# Altium footprint library Connect.PcbLib: 272 footprints (part 5 of 17)
Each footprint in its own frame and in the unit in brackets; x right, y up, seen from the top. Pads: shape width x height; smd on the part's side, far side on the other; paste and mask are expansions set on the pad; w line width, h text height; cw(c..) or ccw(c..) is an arc to the next point about the centre after c.
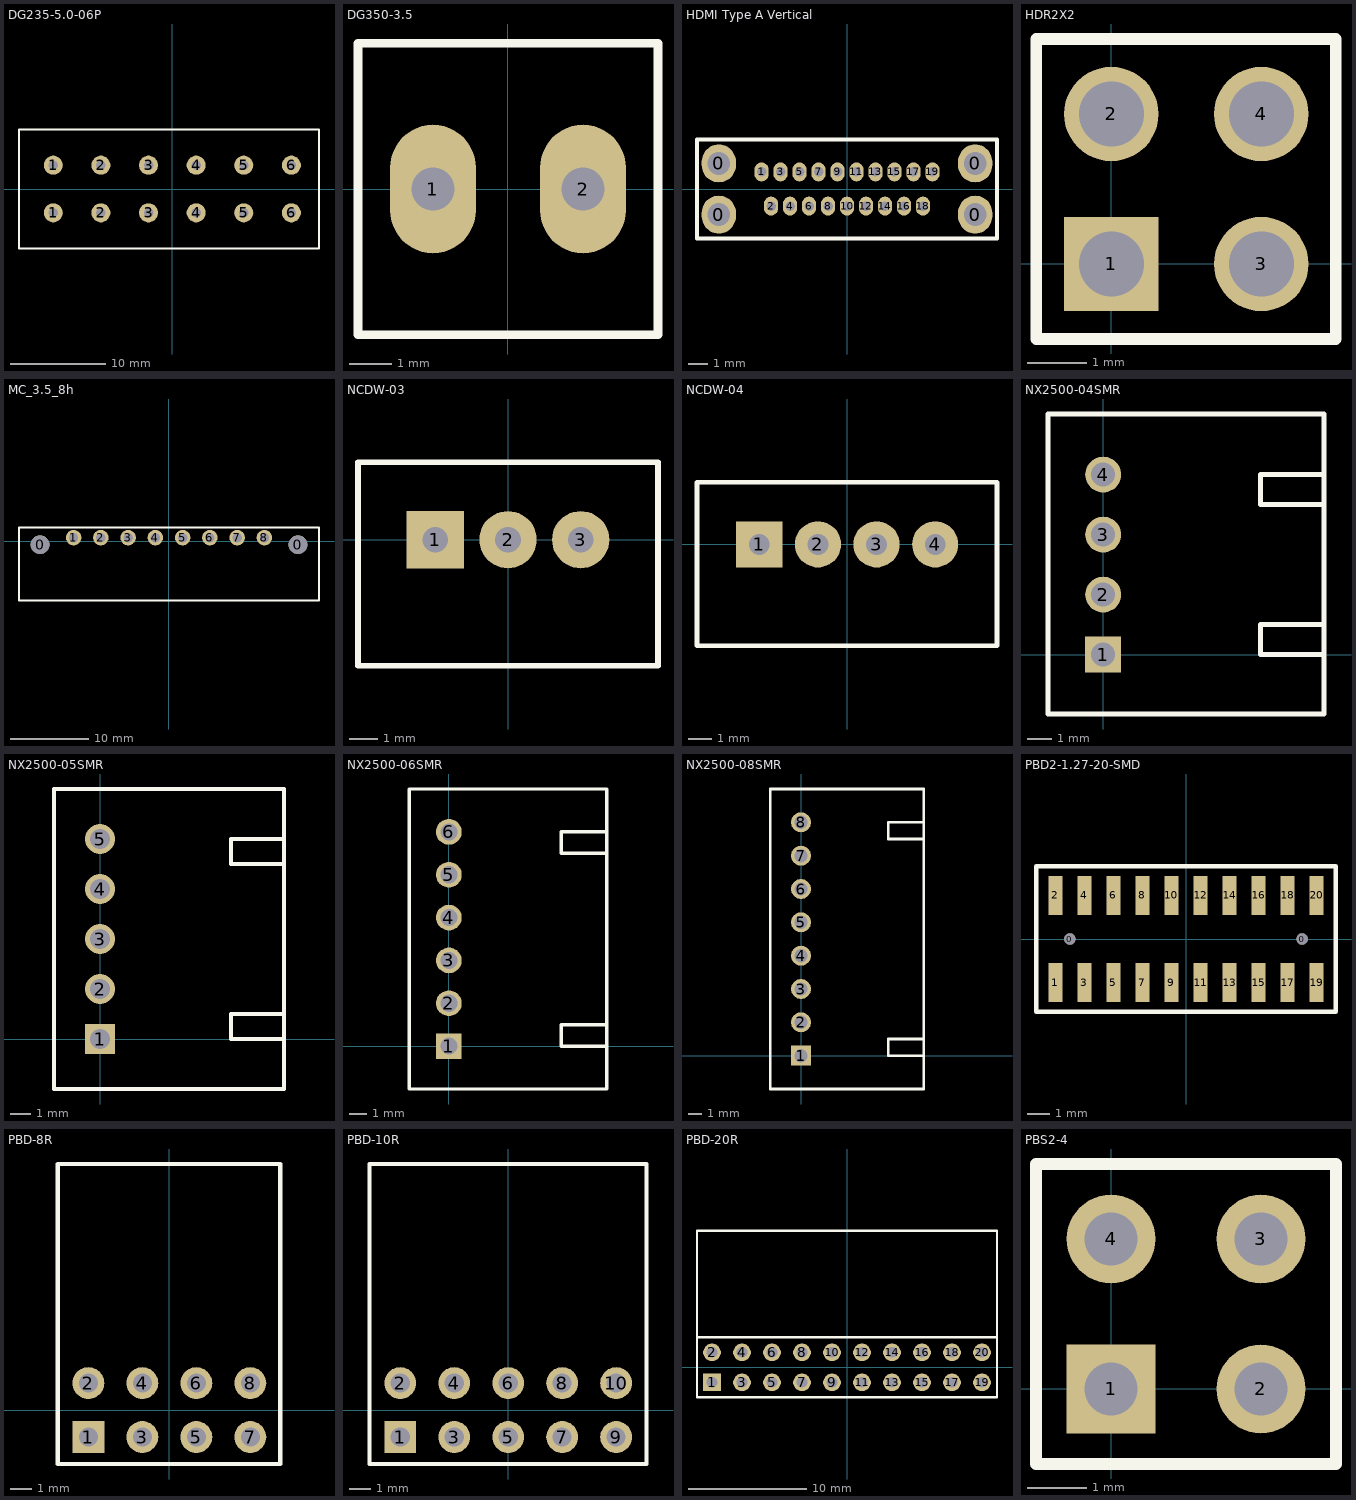
[diagram p4: the footprints below, top view; thin cyan lines are the x and y axes]

## DG235-5.0-06P [mm]
height 15.5
pads (12):
  round 2 hole 1: 1(-12.5,-2.5) 1(-12.5,2.5) 2(-7.5,-2.5) 2(-7.5,2.5) 3(-2.5,-2.5) 3(-2.5,2.5) 4(2.5,-2.5) 4(2.5,2.5) 5(7.5,-2.5) 5(7.5,2.5) 6(12.5,-2.5) 6(12.5,2.5)
Top Overlay:
  lines w0.2: -16.1,-6.25 15.4,-6.25 15.4,6.25 -16.1,6.25 -16.1,-6.25
3D body: height 0, standoff -3.6, extent 2.3,-2.9 2.7,-2.1
3D body: height 0, standoff -3.6, extent 2.3,2.1 2.7,2.9
3D body: height 6, standoff 2, extent 0.75,-6.15 4.75,3.85
3D body: height 12, standoff 11, extent 0.3,-2.75 4.55,2
3D body: height 11, standoff 9, extent 0.575,-1.25 2.575,1.25
3D body: height 9, standoff 7, extent 0.3,-2.5 4.55,2.5
3D body: height 7, standoff 0, extent 0.3,-6.1 5.275,6.1
3D body: height 7, standoff 0, extent -4.7,-6.1 0.275,6.1
3D body: height 9, standoff 7, extent -4.7,-2.5 -0.45,2.5
3D body: height 11, standoff 9, extent -4.425,-1.25 -2.425,1.25
3D body: height 12, standoff 11, extent -4.7,-2.75 -0.45,2
3D body: height 6, standoff 2, extent -4.25,-6.15 -0.25,3.85
3D body: height 0, standoff -3.6, extent -2.7,2.1 -2.3,2.9
3D body: height 0, standoff -3.6, extent -2.7,-2.9 -2.3,-2.1
3D body: height 7, standoff 0, extent -14.7,-6.1 -9.725,6.1
3D body: height 9, standoff 7, extent -14.7,-2.5 -10.45,2.5
3D body: height 11, standoff 9, extent -14.425,-1.25 -12.425,1.25
3D body: height 12, standoff 11, extent -14.7,-2.75 -10.45,2
3D body: height 6, standoff 2, extent -14.25,-6.15 -10.25,3.85
3D body: height 0, standoff -3.6, extent -12.7,2.1 -12.3,2.9
3D body: height 0, standoff -3.6, extent -12.7,-2.9 -12.3,-2.1
3D body: height 0, standoff -3.6, extent -7.7,-2.9 -7.3,-2.1
3D body: height 0, standoff -3.6, extent -7.7,2.1 -7.3,2.9
3D body: height 6, standoff 2, extent -9.25,-6.15 -5.25,3.85
3D body: height 12, standoff 11, extent -9.7,-2.75 -5.45,2
3D body: height 11, standoff 9, extent -9.425,-1.25 -7.425,1.25
3D body: height 9, standoff 7, extent -9.7,-2.5 -5.45,2.5
3D body: height 7, standoff 0, extent -9.7,-6.1 -4.725,6.1
3D body: height 7, standoff 0, extent 5.3,-6.1 10.275,6.1
3D body: height 9, standoff 7, extent 5.3,-2.5 9.55,2.5
3D body: height 11, standoff 9, extent 5.575,-1.25 7.575,1.25
3D body: height 12, standoff 11, extent 5.3,-2.75 9.55,2
3D body: height 6, standoff 2, extent 5.75,-6.15 9.75,3.85
3D body: height 0, standoff -3.6, extent 7.3,2.1 7.7,2.9
3D body: height 0, standoff -3.6, extent 7.3,-2.9 7.7,-2.1
3D body: height 0, standoff -3.6, extent 12.3,-2.9 12.7,-2.1
3D body: height 0, standoff -3.6, extent 12.3,2.1 12.7,2.9
3D body: height 6, standoff 2, extent 10.75,-6.15 14.75,3.85
3D body: height 12, standoff 11, extent 10.3,-2.75 14.55,2
3D body: height 11, standoff 9, extent 10.575,-1.25 12.575,1.25
3D body: height 9, standoff 7, extent 10.3,-2.5 14.55,2.5
3D body: height 7, standoff 0, extent 10.3,-6.1 15.275,6.1

## DG350-3.5 [mm] "DEGSON"
height 8.4
pads (2):
  oval 2x3 hole 1: 1(-1.75,0) 2(1.75,0)
Top Overlay:
  lines w0.2: -3.5,-3.4 3.5,-3.4 3.5,3.4 -3.5,3.4 -3.5,-3.4
3D body "a-tb350-3.5_2.stp": height 8.4, standoff -3.79, extent -4.022,-3.6 3.972,3.4

## HDMI Type A Vertical [mm]
pads (23):
  oval 1.8x2 hole 1.2: 0(-6.75,-1.35) 0(-6.75,1.35) 0(6.75,-1.35) 0(6.75,1.35)
  oval 0.75x1 hole 0.5: 1(-4.5,0.9) 2(-4,-0.9) 3(-3.5,0.9) 4(-3,-0.9) 5(-2.5,0.9) 6(-2,-0.9) 7(-1.5,0.9) 8(-1,-0.9) 9(-0.5,0.9) 10(0,-0.9) 11(0.5,0.9) 12(1,-0.9) 13(1.5,0.9) 14(2,-0.9) 15(2.5,0.9) 16(3,-0.9) 17(3.5,0.9) 18(4,-0.9) 19(4.5,0.9)
Top Overlay:
  lines w0.2: -7.9,-2.6 7.9,-2.6 7.9,2.6 -7.9,2.6 -7.9,-2.6
3D body "HDMI_Type_A_vertical.STEP": height 13.5, standoff -3.8, extent -7.45,-2.475 7.45,2.475

## HDR2X2 [mm] "Connector; Header; 3x2 Position"
pads (4):
  rect 1.6x1.6 hole 1.1: 1(0,0)
  round 1.6 hole 1.1: 2(0,2.54) 3(2.54,0) 4(2.54,2.54)
Top Overlay:
  lines w0.2: -1.27,-1.27 3.8,-1.27 3.8,3.81 -1.27,3.81 -1.27,-1.27

## MC_3.5_8h [mm]
pads (10):
  round 2.4 hole 2.4: 0(-16.55,-0.45) 0(16.55,-0.45)
  round 2 hole 1.2: 1(-12.25,0.45) 2(-8.75,0.45) 3(-5.25,0.45) 4(-1.75,0.45) 5(1.75,0.45) 6(5.25,0.45) 7(8.75,0.45) 8(12.25,0.45)
Top Overlay:
  lines w0.2: -19.25,-7.625 -19.25,1.75 19.25,1.75 19.25,-7.625 -19.25,-7.625
3D body "MC 1,5_8-GF-3,5 - Base strip.stp": height 7.25, standoff -3.4, extent -19.15,-7.55 19.15,1.65

## NCDW-03 [mm]
pads (3):
  rect 2x2 hole 0.9: 1(-2.54,0)
  round 2 hole 0.9: 2(0,0) 3(2.54,0)
Top Overlay:
  lines w0.2: -5.24,-4.4 -5.24,2.7 5.24,2.7 5.24,-4.4 -5.24,-4.4
3D body "NCDW-03_2.54.STEP": height 11.4, standoff -3, extent -5.08,-3.706 5.1,2.5

## NCDW-04 [mm]
pads (4):
  rect 2x2 hole 0.9: 1(-3.81,0)
  round 2 hole 0.9: 2(-1.27,0) 3(1.27,0) 4(3.81,0)
Top Overlay:
  lines w0.2: -6.51,-4.4 -6.51,2.7 6.49,2.7 6.49,-4.4 -6.51,-4.4
3D body "NCDW-04_2.54_.STEP": height 11.4, standoff -3, extent -6.25,-3.9 6.25,2.45

## NX2500-04SMR [mm] "Connector; Header; 1x4 Position; 2.5 mm"
height 5.7
pads (4):
  rect 1.5x1.5 hole 1: 1(0,0)
  round 1.5 hole 1: 2(0,2.5) 3(0,5) 4(0,7.5)
Top Overlay:
  lines w0.2: 9.2,0 6.55,0 6.55,1.25 9.2,1.25 ; 9.2,6.25 6.55,6.25 6.55,7.5 9.2,7.5 ; -2.3,-2.475 -2.3,10.025 9.2,10.025 9.2,-2.475 -2.3,-2.475

## NX2500-05SMR [mm] "Connector; Header; 1x5 Position; 2.5 mm"
height 5.7
pads (5):
  rect 1.5x1.5 hole 1: 1(0,0)
  round 1.5 hole 1: 2(0,2.5) 3(0,5) 4(0,7.5) 5(0,10)
Top Overlay:
  lines w0.2: 9.2,0 6.55,0 6.55,1.25 9.2,1.25 ; 9.2,8.75 6.55,8.75 6.55,10 9.2,10 ; -2.3,-2.5 -2.3,12.5 9.2,12.5 9.2,-2.5 -2.3,-2.5

## NX2500-06SMR [mm] "Connector; Header; 1x6 Position; 2.5 mm"
height 5.7
pads (6):
  rect 1.5x1.5 hole 1: 1(0,0)
  round 1.5 hole 1: 2(0,2.5) 3(0,5) 4(0,7.5) 5(0,10) 6(0,12.5)
Top Overlay:
  lines w0.2: 9.2,0 6.55,0 6.55,1.25 9.2,1.25 ; 9.2,11.25 6.55,11.25 6.55,12.5 9.2,12.5 ; -2.3,-2.5 -2.3,15 9.2,15 9.2,-2.5 -2.3,-2.5

## NX2500-08SMR [mm] "Connector; Header; 1x8 Position; 2.5 mm"
height 5.7
pads (8):
  rect 1.5x1.5 hole 1: 1(0,0)
  round 1.5 hole 1: 2(0,2.5) 3(0,5) 4(0,7.5) 5(0,10) 6(0,12.5) 7(0,15) 8(0,17.5)
Top Overlay:
  lines w0.2: 9.2,0 6.55,0 6.55,1.25 9.2,1.25 ; 9.2,16.25 6.55,16.25 6.55,17.5 9.2,17.5 ; -2.3,-2.5 -2.3,20 9.2,20 9.2,-2.5 -2.3,-2.5
3D body "CON8_2_5mmK.STEP": height 5.7, standoff -3.73, extent -2.25,-2.5 9.25,20

## PBD2-1.27-20-SMD [mm] "Connector; Header; 20 Position"
height 4.5
pads (22):
  round 0.5 hole 0.5: 0(-5.08,0) 0(5.08,0)
  rect 0.6x1.7 smd: 1(-5.715,-1.905) 2(-5.715,1.905) 3(-4.445,-1.905) 4(-4.445,1.905) 5(-3.175,-1.905) 6(-3.175,1.905) 7(-1.905,-1.905) 8(-1.905,1.905) 9(-0.635,-1.905) 10(-0.635,1.905) 11(0.635,-1.905) 12(0.635,1.905) 13(1.905,-1.905) 14(1.905,1.905) 15(3.175,-1.905) 16(3.175,1.905) 17(4.445,-1.905) 18(4.445,1.905) 19(5.715,-1.905) 20(5.715,1.905)
Top Overlay:
  lines w0.2: -6.55,-3.175 -6.55,3.175 6.55,3.175 6.55,-3.175 -6.55,-3.175
3D body "PBD2_1.27_20pin.stp": height 4.5, standoff 0, extent -6.55,-2.3 6.55,2.3

## PBD-8R [mm]
height 5
pads (8):
  rect 1.5x1.5 hole 0.9: 1(-3.81,-1.27)
  round 1.5 hole 0.9: 2(-3.81,1.27) 3(-1.27,-1.27) 4(-1.27,1.27) 5(1.27,-1.27) 6(1.27,1.27) 7(3.81,-1.27) 8(3.81,1.27)
Top Overlay:
  lines w0.2: -5.255,-2.54 5.22,-2.54 5.22,11.58 -5.255,11.58 -5.255,-2.54
3D body "PBD-04R.STEP": height 5.1, standoff -2.9, extent 0,-1.575 5.08,11.425
3D body "PBD-04R.STEP": height 5.1, standoff -2.9, extent -5.08,-1.575 0,11.425

## PBD-10R [mm]
height 5
pads (10):
  rect 1.5x1.5 hole 0.9: 1(-5.08,-1.27)
  round 1.5 hole 0.9: 2(-5.08,1.27) 3(-2.54,-1.27) 4(-2.54,1.27) 5(0,-1.27) 6(0,1.27) 7(2.54,-1.27) 8(2.54,1.27) 9(5.08,-1.27) 10(5.08,1.27)
Top Overlay:
  lines w0.2: -6.525,-2.54 -6.525,11.58 6.505,11.58 6.505,-2.54 -6.525,-2.54
3D body "PBD-04R.STEP": height 5.1, standoff -2.9, extent -6.35,-1.575 -1.27,11.425
3D body "PBD-04R.STEP": height 5.1, standoff -2.9, extent -1.27,-1.575 3.81,11.425
3D body "PBD-04R.STEP": height 5.1, standoff -2.9, extent 1.27,-1.575 6.35,11.425

## PBD-20R [mm]
height 5
pads (20):
  rect 1.5x1.5 hole 0.9: 1(-11.43,-1.27)
  round 1.5 hole 0.9: 2(-11.43,1.27) 3(-8.89,-1.27) 4(-8.89,1.27) 5(-6.35,-1.27) 6(-6.35,1.27) 7(-3.81,-1.27) 8(-3.81,1.27) 9(-1.27,-1.27) 10(-1.27,1.27) 11(1.27,-1.27) 12(1.27,1.27) 13(3.81,-1.27) 14(3.81,1.27) 15(6.35,-1.27) 16(6.35,1.27) 17(8.89,-1.27) 18(8.89,1.27) 19(11.43,-1.27) 20(11.43,1.27)
Top Overlay:
  lines w0.2: 12.67,2.54 -12.7,2.54 ; -12.7,2.54 -12.7,-2.54 12.7,-2.54 12.7,2.54 12.7,11.58 -12.7,11.58 -12.7,2.54
3D body "PBD-20R.STEP": height 5, standoff -3, extent -12.7,-1.57 12.7,11.43

## PBS2-4 [mm] "Connector; Header; 4 Position"
height 7.5
pads (4):
  rect 1.5x1.5 hole 0.9: 1(0,0)
  round 1.5 hole 0.9: 2(2.54,0) 3(2.54,2.54) 4(0,2.54)
Top Overlay:
  lines w0.2: -1.27,-1.27 -1.27,1.27 -1.27,3.81 3.81,3.81 3.81,1.27 3.81,-1.27 -1.27,-1.27
3D body "PBD-2.stp": height 8.5, standoff -3.15, extent -1.27,-1.27 1.27,3.81
3D body "PBD-2.stp": height 8.5, standoff -3.15, extent 1.27,-1.27 3.81,3.81